# Altium schematic symbol library LATTICEPLDS_Library.SchLib: 291 symbols (part 30 of 32) (continued)
## LFXP15/20-F256/FN256 (continued)
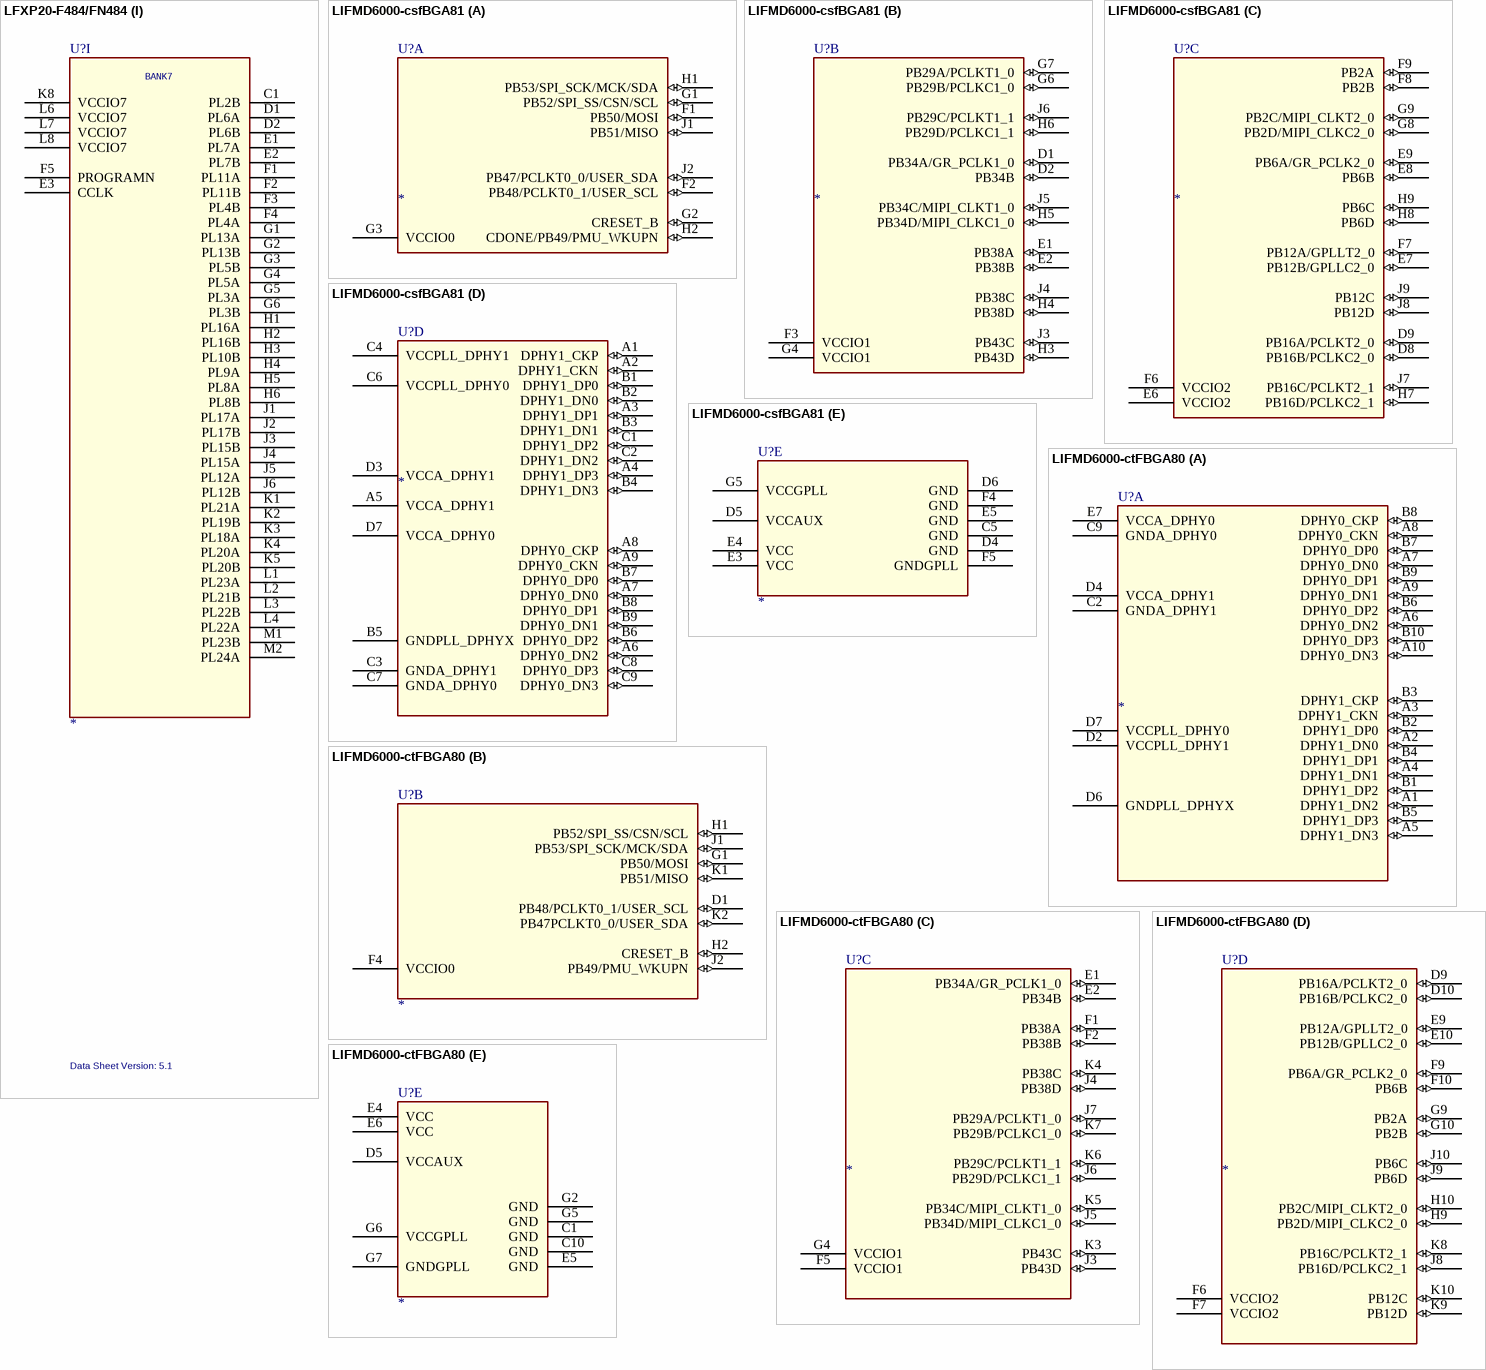
[diagram p280: symbols LFXP20-F484/FN484 to LIFMD6000-ctFBGA80]
part A text: BANK 7; (1 OF 5); BANK 6
part B text: BANK 5; (2 OF 5); BANK 4
part C text: BANK 3; (3 OF 5); BANK 2
part D text: BANK 1; (4 OF 5); BANK 0
part E text: (5 OF 5); SLEEPN (LFXP "C" devices only) / TOE (LFXP "E" devices only)

## LFXP20-F484/FN484
designator U?  Data Sheet Version: 5.1
SWAP_INFO: (S1+S2+S3+S4+S5+S6+S7+S8+S9); SPLIT_INST: TRUE
part A pins: A1 GND (power), A2 GND (power), A21 GND (power), A22 GND (power), AA1 GND (power), AA22 GND (power), AB1 GND (power), AB2 GND (power), AB21 GND (power), AB22 GND (power), B1 GND (power), B22 GND (power), D19 TDI, D20 TCK, E19 TMS, E20 VCCJ (power), F10 VCC (power), F13 VCC (power), F20 TDO, G7 VCCAUX (power), G8 VCCAUX (power), G9 VCC (power), G10 VCC (power), G13 VCC (power), G14 VCC (power), G15 VCCAUX (power), G16 VCCAUX (power), H7 VCCAUX (power), H8 VCC (power), H9 GND (power), H14 GND (power), H15 VCC (power), H16 VCCAUX (power), J7 VCC (power), J8 GND (power), J9 GND (power), J10 GND (power), J11 GND (power), J12 GND (power), J13 GND (power), J14 GND (power), J15 GND (power), J16 VCC (power), K6 VCC (power), K7 VCC (power), K9 GND (power), K10 GND (power), K11 GND (power), K12 GND (power), K13 GND (power), K14 GND (power), K16 VCC (power), K17 VCC (power), L5 VCCP0 (power), L9 GND (power), L10 GND (power), L11 GND (power), L12 GND (power), L13 GND (power), L14 GND (power), L18 VCCP1 (power), M9 GND (power), M10 GND (power), M11 GND (power), M12 GND (power), M13 GND (power), M14 GND (power), M20 GNDP1 (power), N2 GNDP0 (power), N6 VCC (power), N7 VCC (power), N9 GND (power), N10 GND (power), N11 GND (power), N12 GND (power), N13 GND (power), N14 GND (power), N16 VCC (power), N17 VCC (power), P7 VCC (power), P8 GND (power), P9 GND (power), P10 GND (power), P11 GND (power), P12 GND (power), P13 GND (power), P14 GND (power), P15 GND (power), P16 VCC (power), R7 VCCAUX (power), R8 VCC (power), R9 GND (power), R14 GND (power), R15 VCC (power), R16 VCCAUX (power), T7 VCCAUX (power), T8 VCCAUX (power), T9 VCC (power), T10 VCC (power), T13 VCC (power), T14 VCC (power), T15 VCCAUX (power), T16 VCCAUX (power), U10 VCC (power), U13 VCC (power), W4 SLEEPN/TOE
part B pins: A3 PT12A, A4 PT14A, A5 PT16A, A6 PT19A, A7 PT21A, A8 PT24A, A9 PT25A, A10 PT29A, A11 PT29B, B2 PT10B, B3 PT12B, B4 PT14B, B5 PT16B, B6 PT19B, B7 PT21B, B8 PT24B, B9 PT26B, B10 PT22A, B11 PT27B, C2 PT9A, C3 PT8B, C4 PT5A, C5 PT5B, C6 PT6B, C7 PT11A, C8 PT15B, C9 PT20B, C10 PT22B, C11 PT27A, D3 PT8A, D4 CFG1, D5 DONE, D6 PT6A, D7 PT11B, D8 PT15A, D9 PT20A, D10 PT23A, D11 PT28B, E4 PT3B, E5 CFG0, E6 PT4A, E7 PT7A, E8 PT13A, E9 PT17A, E10 PT23B, E11 PT28A, F6 PT4B, F7 PT7B, F8 PT13B, F9 PT18B, F11 VCCIO0 (power), G11 VCCIO0 (power), H10 VCCIO0 (power), H11 VCCIO0 (power)
part C pins: A12 PT30A, A13 PT30B, A14 PT34B, A15 PT37B, A16 PT38B, A17 PT42B, A18 PT44B, A19 PT46B, A20 PT47B, B12 PT32A, B13 PT35A, B14 PT33A, B15 PT37A, B16 PT38A, B17 PT41A, B18 PT44A, B19 PT46A, B20 PT47A, B21 PT53A, C12 PT32B, C13 PT35B, C14 PT39A, C15 PT45B, C16 PT48B, C17 PT51B, C18 PT54A, C19 PT54B, C20 PT56A, C21 PT53B, D12 PT31B, D13 PT36A, D14 PT39B, D15 PT45A, D16 PT48A, D17 PT51A, D18 PT55B, E12 PT31A, E13 PT36B, E14 PT40B, E15 PT43A, E16 PT52A, E17 PT52B, E18 PT55A, F12 VCCIO1 (power), F14 PT40A, F15 PT43B, F16 PT49A, F17 PT50B, G12 VCCIO1 (power), H12 VCCIO1 (power), H13 VCCIO1 (power)
part D pins: C22 PR2B, D21 PR6B, D22 PR6A, E21 PR7B, E22 PR7A, F18 PR3B, F19 PR3A, F21 PR11B, F22 PR11A, G17 PR4B, G18 PR4A, G19 PR5A, G20 PR5B, G21 PR12B, G22 PR12A, H17 PR8B, H18 PR8A, H19 PR9A, H20 PR10B, H21 PR16B, H22 PR16A, J17 PR13B, J18 PR13A, J19 PR15A, J20 PR15B, J21 PR20B, J22 PR20A, K15 VCCIO2 (power), K18 PR19B, K19 PR18A, K20 PR17A, K21 PR17B, K22 PR21A, L15 VCCIO2 (power), L16 VCCIO2 (power), L17 VCCIO2 (power), L19 PR22B, L20 PR22A, L21 PR21B, L22 PR23A, M21 PR24A, M22 PR23B
part E pins: M15 VCCIO3 (power), M16 VCCIO3 (power), M17 VCCIO3 (power), M18 PR28A, M19 PR25B, N15 VCCIO3 (power), N18 PR28B, N19 PR29B, N20 PR29A, N21 PR26A, N22 PR26B, P17 PR38B, P18 PR38A, P19 PR33B, P20 PR33A, P21 PR27A, P22 PR27B, R17 PR42A, R18 PR42B, R19 PR37B, R20 PR37A, R21 PR30A, R22 PR31B, T17 PR44B, T18 PR44A, T19 PR43B, T20 PR43A, T21 PR32A, T22 PR32B, U19 PR46A, U20 PR46B, U21 PR34A, U22 PR34B, V19 PR47A, V20 PR45B, V21 PR36A, V22 PR36B, W20 PR45A, W21 PR39A, W22 PR40B, Y21 PR41A, Y22 PR41B
part F pins: AA12 PB30B, AA13 PB33A, AA14 PB37A, AA15 PB37B, AA16 PB45A, AA17 PB45B, AA18 PB46A, AA19 PB46B, AA20 PB48A, AA21 PB48B, AB13 PB32A, AB14 PB32B, AB15 PB35A, AB16 PB35B, AB17 PB38A, AB18 PB38B, AB19 PB41A, AB20 PB42B, R12 VCCIO4 (power), R13 VCCIO4 (power), T12 VCCIO4 (power), U12 VCCIO4 (power), U14 PB40A, U15 PB43B, U16 PB52B, U17 PB55A, U18 PB53A, V12 PB31B, V13 PB36A, V14 PB40B, V15 PB43A, V16 PB52A, V17 PB55B, V18 PB53B, W12 PB31A, W13 PB36B, W14 PB39A, W15 PB44B, W16 PB47B, W17 PB56A, W18 PB54B, W19 PB54A, Y12 PB30A, Y13 PB34B, Y14 PB39B, Y15 PB44A, Y16 PB47A, Y17 PB49A, Y18 PB50B, Y19 PB51A, Y20 PB51B
part G pins: AA2 PB8A, AA3 PB8B, AA4 PB12A, AA5 PB12B, AA6 PB14A, AA7 PB14B, AA8 PB21A, AA9 PB21B, AA10 PB26B, AA11 PB28B, AB3 PB13A, AB4 PB13B, AB5 PB20A, AB6 PB20B, AB7 PB23A, AB8 PB23B, AB9 PB24A, AB10 PB24B, AB11 PB29A, AB12 PB29B, R10 VCCIO5 (power), R11 VCCIO5 (power), T11 VCCIO5 (power), U5 PB4A, U6 PB6B, U7 PB10B, U8 PB15A, U9 PB18B, U11 VCCIO5 (power), V5 PB4B, V6 PB6A, V7 PB9A, V8 PB15B, V9 PB17A, V10 PB22B, V11 PB27B, W5 INITN, W6 PB7A, W7 PB11B, W8 PB16B, W9 PB19B, W10 PB22A, W11 PB27A, Y3 PB3B, Y4 PB5A, Y5 PB5B, Y6 PB7B, Y7 PB11A, Y8 PB16A, Y9 PB19A, Y10 PB25A, Y11 PB28A
part H pins: M3 PL27B, M4 PL27A, M5 PL30A, M6 VCCIO6 (power), M7 VCCIO6 (power), M8 VCCIO6 (power), N1 PL25B, N3 PL29A, N4 PL29B, N5 PL31B, N8 VCCIO6 (power), P1 PL26B, P2 PL26A, P3 PL34A, P4 PL34B, P5 PL36B, P6 PL36A, R1 PL28B, R2 PL28A, R3 PL39A, R4 PL40B, R5 PL41B, R6 PL41A, T1 PL32B, T2 PL32A, T3 PL43A, T4 PL43B, T5 PL45B, T6 PL45A, U1 PL33B, U2 PL33A, U3 PL46A, U4 PL46B, V1 PL37B, V2 PL37A, V3 PL44B, V4 PL47A, W1 PL38B, W2 PL38A, W3 PL44A, Y1 PL42B, Y2 PL42A
part I pins: C1 PL2B, D1 PL6A, D2 PL6B, E1 PL7A, E2 PL7B, E3 CCLK, F1 PL11A, F2 PL11B, F3 PL4B, F4 PL4A, F5 PROGRAMN, G1 PL13A, G2 PL13B, G3 PL5B, G4 PL5A, G5 PL3A, G6 PL3B, H1 PL16A, H2 PL16B, H3 PL10B, H4 PL9A, H5 PL8A, H6 PL8B, J1 PL17A, J2 PL17B, J3 PL15B, J4 PL15A, J5 PL12A, J6 PL12B, K1 PL21A, K2 PL19B, K3 PL18A, K4 PL20A, K5 PL20B, K8 VCCIO7 (power), L1 PL23A, L2 PL21B, L3 PL22B, L4 PL22A, L6 VCCIO7 (power), L7 VCCIO7 (power), L8 VCCIO7 (power), M1 PL23B, M2 PL24A
part A text: SUPPLIES
part B text: BANK0
part C text: BANK1
part D text: BANK2
part E text: BANK3
part F text: BANK4
part G text: BANK5
part H text: BANK6
part I text: BANK7

## LIFMD6000-csfBGA81
designator U?
SPLIT_INST: TRUE; SWAP_INFO: (S1+S2+S3+S4+S5)
part A pins: F1 PB50/MOSI (io), F2 PB48/PCLKT0_1/USER_SCL (io), G1 PB52/SPI_SS/CSN/SCL (io), G2 CRESET_B (io), G3 VCCIO0 (power), H1 PB53/SPI_SCK/MCK/SDA (io), H2 CDONE/PB49/PMU_WKUPN (io), J1 PB51/MISO (io), J2 PB47/PCLKT0_0/USER_SDA (io)
part B pins: D1 PB34A/GR_PCLK1_0 (io), D2 PB34B (io), E1 PB38A (io), E2 PB38B (io), F3 VCCIO1 (power), G4 VCCIO1 (power), G6 PB29B/PCLKC1_0 (io), G7 PB29A/PCLKT1_0 (io), H3 PB43D (io), H4 PB38D (io), H5 PB34D/MIPI_CLKC1_0 (io), H6 PB29D/PCLKC1_1 (io), J3 PB43C (io), J4 PB38C (io), J5 PB34C/MIPI_CLKT1_0 (io), J6 PB29C/PCLKT1_1 (io)
part C pins: D8 PB16B/PCLKC2_0 (io), D9 PB16A/PCLKT2_0 (io), E6 VCCIO2 (power), E7 PB12B/GPLLC2_0 (io), E8 PB6B (io), E9 PB6A/GR_PCLK2_0 (io), F6 VCCIO2 (power), F7 PB12A/GPLLT2_0 (io), F8 PB2B (io), F9 PB2A (io), G8 PB2D/MIPI_CLKC2_0 (io), G9 PB2C/MIPI_CLKT2_0 (io), H7 PB16D/PCLKC2_1 (io), H8 PB6D (io), H9 PB6C (io), J7 PB16C/PCLKT2_1 (io), J8 PB12D (io), J9 PB12C (io)
part D pins: A1 DPHY1_CKP (io), A2 DPHY1_CKN (io), A3 DPHY1_DP1 (io), A4 DPHY1_DP3 (io), A5 VCCA_DPHY1 (power), A6 DPHY0_DN2 (io), A7 DPHY0_DN0 (io), A8 DPHY0_CKP (io), A9 DPHY0_CKN (io), B1 DPHY1_DP0 (io), B2 DPHY1_DN0 (io), B3 DPHY1_DN1 (io), B4 DPHY1_DN3 (io), B5 GNDPLL_DPHYX (power), B6 DPHY0_DP2 (io), B7 DPHY0_DP0 (io), B8 DPHY0_DP1 (io), B9 DPHY0_DN1 (io), C1 DPHY1_DP2 (io), C2 DPHY1_DN2 (io), C3 GNDA_DPHY1 (power), C4 VCCPLL_DPHY1 (power), C6 VCCPLL_DPHY0 (power), C7 GNDA_DPHY0 (power), C8 DPHY0_DP3 (io), C9 DPHY0_DN3 (io), D3 VCCA_DPHY1 (power), D7 VCCA_DPHY0 (power)
part E pins: C5 GND (power), D4 GND (power), D5 VCCAUX (power), D6 GND (power), E3 VCC (power), E4 VCC (power), E5 GND (power), F4 GND (power), F5 GNDGPLL (power), G5 VCCGPLL (power)

## LIFMD6000-ctFBGA80
designator U?
SWAP_INFO: (S1+S2+S3+S4+S5); SPLIT_INST: TRUE
part A pins: A1 DPHY1_DN2 (io), A2 DPHY1_DN0 (io), A3 DPHY1_CKN (io), A4 DPHY1_DN1 (io), A5 DPHY1_DN3 (io), A6 DPHY0_DN2 (io), A7 DPHY0_DN0 (io), A8 DPHY0_CKN (io), A9 DPHY0_DN1 (io), A10 DPHY0_DN3 (io), B1 DPHY1_DP2 (io), B2 DPHY1_DP0 (io), B3 DPHY1_CKP (io), B4 DPHY1_DP1 (io), B5 DPHY1_DP3 (io), B6 DPHY0_DP2 (io), B7 DPHY0_DP0 (io), B8 DPHY0_CKP (io), B9 DPHY0_DP1 (io), B10 DPHY0_DP3 (io), C2 GNDA_DPHY1 (power), C9 GNDA_DPHY0 (power), D2 VCCPLL_DPHY1 (power), D4 VCCA_DPHY1 (power), D6 GNDPLL_DPHYX (power), D7 VCCPLL_DPHY0 (power), E7 VCCA_DPHY0 (power)
part B pins: D1 PB48/PCLKT0_1/USER_SCL (io), F4 VCCIO0 (power), G1 PB50/MOSI (io), H1 PB52/SPI_SS/CSN/SCL (io), H2 CRESET_B (io), J1 PB53/SPI_SCK/MCK/SDA (io), J2 PB49/PMU_WKUPN (io), K1 PB51/MISO (io), K2 PB47PCLKT0_0/USER_SDA (io)
part C pins: E1 PB34A/GR_PCLK1_0 (io), E2 PB34B (io), F1 PB38A (io), F2 PB38B (io), F5 VCCIO1 (power), G4 VCCIO1 (power), J3 PB43D (io), J4 PB38D (io), J5 PB34D/MIPI_CLKC1_0 (io), J6 PB29D/PCLKC1_1 (io), J7 PB29A/PCLKT1_0 (io), K3 PB43C (io), K4 PB38C (io), K5 PB34C/MIPI_CLKT1_0 (io), K6 PB29C/PCLKT1_1 (io), K7 PB29B/PCLKC1_0 (io)
part D pins: D9 PB16A/PCLKT2_0 (io), D10 PB16B/PCLKC2_0 (io), E9 PB12A/GPLLT2_0 (io), E10 PB12B/GPLLC2_0 (io), F6 VCCIO2 (power), F7 VCCIO2 (power), F9 PB6A/GR_PCLK2_0 (io), F10 PB6B (io), G9 PB2A (io), G10 PB2B (io), H9 PB2D/MIPI_CLKC2_0 (io), H10 PB2C/MIPI_CLKT2_0 (io), J8 PB16D/PCLKC2_1 (io), J9 PB6D (io), J10 PB6C (io), K8 PB16C/PCLKT2_1 (io), K9 PB12D (io), K10 PB12C (io)
part E pins: C1 GND (power), C10 GND (power), D5 VCCAUX (power), E4 VCC (power), E5 GND (power), E6 VCC (power), G2 GND (power), G5 GND (power), G6 VCCGPLL (power), G7 GNDGPLL (power)

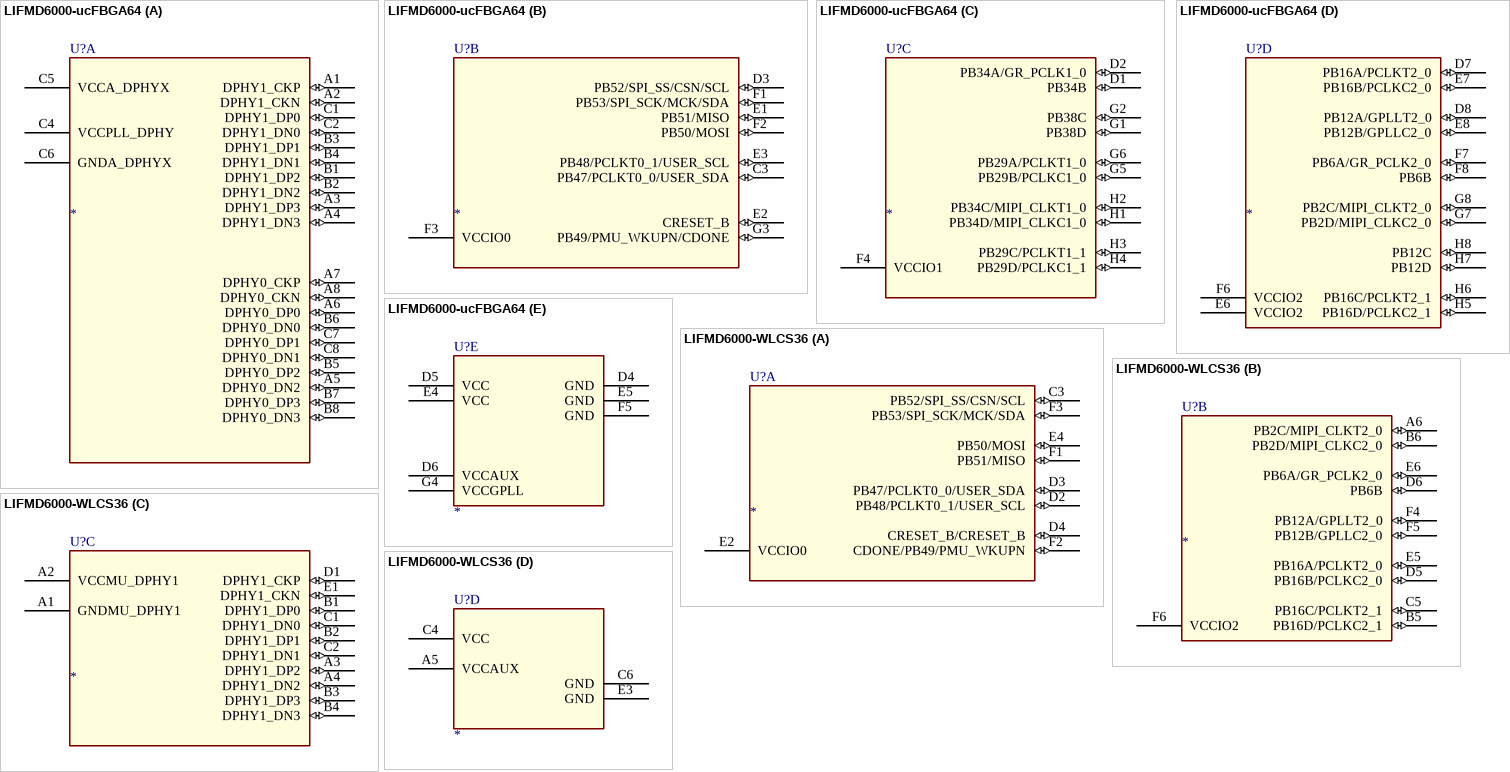
[diagram p281: symbols LIFMD6000-ucFBGA64 to LIFMD6000-WLCS36]

## LIFMD6000-ucFBGA64
designator U?
SPLIT_INST: TRUE; SWAP_INFO: (S1+S2+S3+S4+S5)
part A pins: A1 DPHY1_CKP (io), A2 DPHY1_CKN (io), A3 DPHY1_DP3 (io), A4 DPHY1_DN3 (io), A5 DPHY0_DN2 (io), A6 DPHY0_DP0 (io), A7 DPHY0_CKP (io), A8 DPHY0_CKN (io), B1 DPHY1_DP2 (io), B2 DPHY1_DN2 (io), B3 DPHY1_DP1 (io), B4 DPHY1_DN1 (io), B5 DPHY0_DP2 (io), B6 DPHY0_DN0 (io), B7 DPHY0_DP3 (io), B8 DPHY0_DN3 (io), C1 DPHY1_DP0 (io), C2 DPHY1_DN0 (io), C4 VCCPLL_DPHY (power), C5 VCCA_DPHYX (power), C6 GNDA_DPHYX (power), C7 DPHY0_DP1 (io), C8 DPHY0_DN1 (io)
part B pins: C3 PB47/PCLKT0_0/USER_SDA (io), D3 PB52/SPI_SS/CSN/SCL (io), E1 PB51/MISO (io), E2 CRESET_B (io), E3 PB48/PCLKT0_1/USER_SCL (io), F1 PB53/SPI_SCK/MCK/SDA (io), F2 PB50/MOSI (io), F3 VCCIO0 (power), G3 PB49/PMU_WKUPN/CDONE (io)
part C pins: D1 PB34B (io), D2 PB34A/GR_PCLK1_0 (io), F4 VCCIO1 (power), G1 PB38D (io), G2 PB38C (io), G5 PB29B/PCLKC1_0 (io), G6 PB29A/PCLKT1_0 (io), H1 PB34D/MIPI_CLKC1_0 (io), H2 PB34C/MIPI_CLKT1_0 (io), H3 PB29C/PCLKT1_1 (io), H4 PB29D/PCLKC1_1 (io)
part D pins: D7 PB16A/PCLKT2_0 (io), D8 PB12A/GPLLT2_0 (io), E6 VCCIO2 (power), E7 PB16B/PCLKC2_0 (io), E8 PB12B/GPLLC2_0 (io), F6 VCCIO2 (power), F7 PB6A/GR_PCLK2_0 (io), F8 PB6B (io), G7 PB2D/MIPI_CLKC2_0 (io), G8 PB2C/MIPI_CLKT2_0 (io), H5 PB16D/PCLKC2_1 (io), H6 PB16C/PCLKT2_1 (io), H7 PB12D (io), H8 PB12C (io)
part E pins: D4 GND (power), D5 VCC (power), D6 VCCAUX (power), E4 VCC (power), E5 GND (power), F5 GND (power), G4 VCCGPLL (power)

## LIFMD6000-WLCS36
designator U?
SWAP_INFO: (S1+S2+S3+S4); SPLIT_INST: TRUE
part A pins: C3 PB52/SPI_SS/CSN/SCL (io), D2 PB48/PCLKT0_1/USER_SCL (io), D3 PB47/PCLKT0_0/USER_SDA (io), D4 CRESET_B/CRESET_B (io), E2 VCCIO0 (power), E4 PB50/MOSI (io), F1 PB51/MISO (io), F2 CDONE/PB49/PMU_WKUPN (io), F3 PB53/SPI_SCK/MCK/SDA (io)
part B pins: A6 PB2C/MIPI_CLKT2_0 (io), B5 PB16D/PCLKC2_1 (io), B6 PB2D/MIPI_CLKC2_0 (io), C5 PB16C/PCLKT2_1 (io), D5 PB16B/PCLKC2_0 (io), D6 PB6B (io), E5 PB16A/PCLKT2_0 (io), E6 PB6A/GR_PCLK2_0 (io), F4 PB12A/GPLLT2_0 (io), F5 PB12B/GPLLC2_0 (io), F6 VCCIO2 (power)
part C pins: A1 GNDMU_DPHY1 (power), A2 VCCMU_DPHY1 (power), A3 DPHY1_DP2 (io), A4 DPHY1_DN2 (io), B1 DPHY1_DP0 (io), B2 DPHY1_DP1 (io), B3 DPHY1_DP3 (io), B4 DPHY1_DN3 (io), C1 DPHY1_DN0 (io), C2 DPHY1_DN1 (io), D1 DPHY1_CKP (io), E1 DPHY1_CKN (io)
part D pins: A5 VCCAUX (power), C4 VCC (power), C6 GND (power), E3 GND (power)

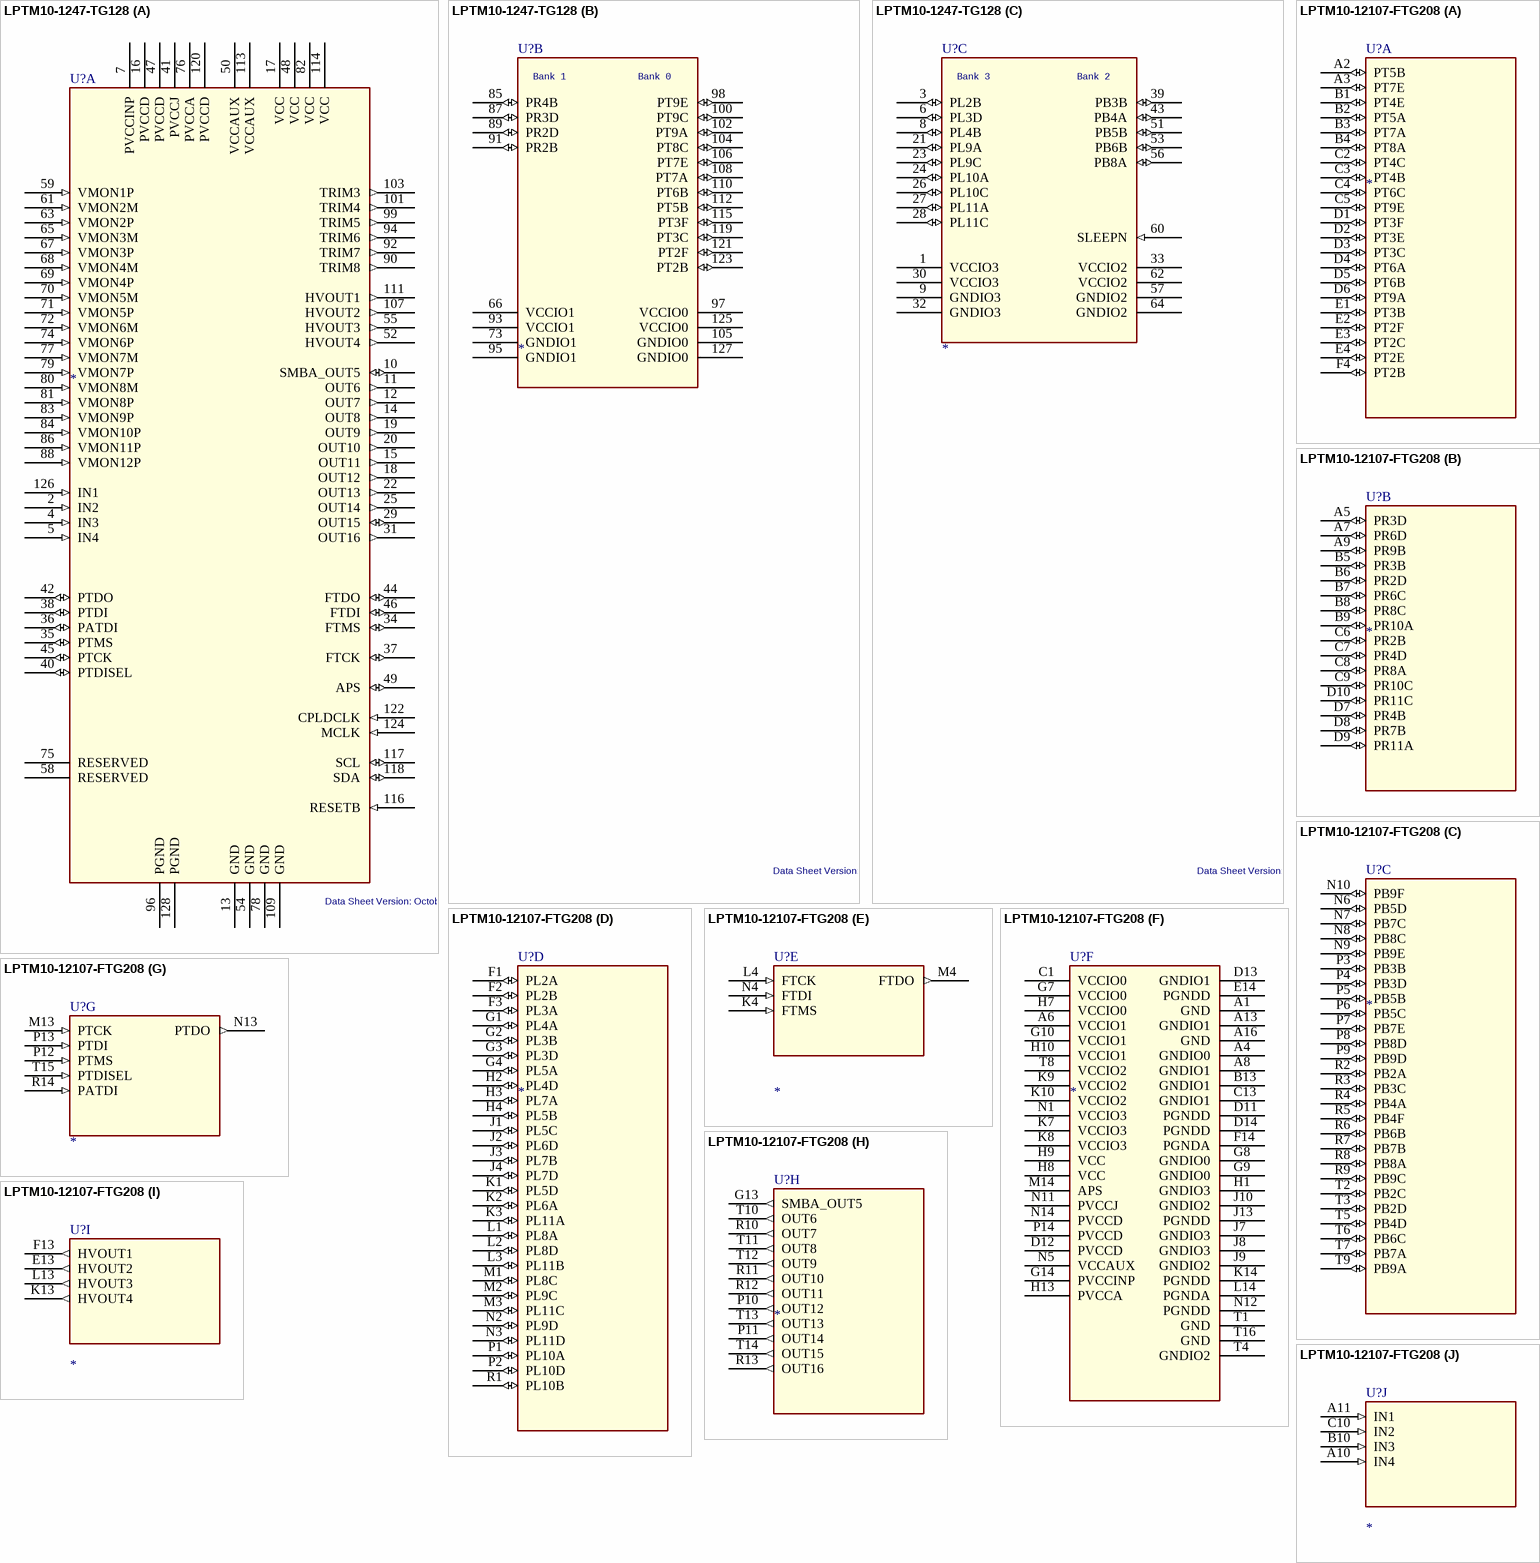
[diagram p282: symbols LPTM10-1247-TG128 to LPTM10-12107-FTG208]

## LPTM10-1247-TG128
designator U?  Data Sheet Version: October 2010
SPLIT_INST: TRUE; SWAP_INFO: (S1+S2+S3)
part A pins: 2 IN2 (in), 4 IN3 (in), 5 IN4 (in), 7 PVCCINP (power), 10 SMBA_OUT5 (io), 11 OUT6 (out), 12 OUT7 (out), 13 GND (power), 14 OUT8 (out), 15 OUT11 (out), 16 PVCCD (power), 17 VCC (power), 18 OUT12 (out), 19 OUT9 (out), 20 OUT10 (out), 22 OUT13 (out), 25 OUT14 (out), 29 OUT15 (io), 31 OUT16 (out), 34 FTMS (io), 35 PTMS (io), 36 PATDI (io), 37 FTCK (io), 38 PTDI (io), 40 PTDISEL (io), 41 PVCCJ (power), 42 PTDO (io), 44 FTDO (io), 45 PTCK (io), 46 FTDI (io), 47 PVCCD (power), 48 VCC (power), 49 APS (io), 50 VCCAUX (power), 52 HVOUT4 (out), 54 GND (power), 55 HVOUT3 (out), 58 RESERVED, 59 VMON1P (in), 61 VMON2M (in), 63 VMON2P (in), 65 VMON3M (in), 67 VMON3P (in), 68 VMON4M (in), 69 VMON4P (in), 70 VMON5M (in), 71 VMON5P (in), 72 VMON6M (in), 74 VMON6P (in), 75 RESERVED, 76 PVCCA (power), 77 VMON7M (in), 78 GND (power), 79 VMON7P (in), 80 VMON8M (in), 81 VMON8P (in), 82 VCC (power), 83 VMON9P (in), 84 VMON10P (in), 86 VMON11P (in), 88 VMON12P (in), 90 TRIM8 (out), 92 TRIM7 (out), 94 TRIM6 (out), 96 PGND (power), 99 TRIM5 (out), 101 TRIM4 (out), 103 TRIM3 (out), 107 HVOUT2 (out), 109 GND (power), 111 HVOUT1 (out), 113 VCCAUX (power), 114 VCC (power), 116 RESETB (in), 117 SCL (io), 118 SDA (io), 120 PVCCD (power), 122 CPLDCLK (in), 124 MCLK (in), 126 IN1 (in), 128 PGND (power)
part B pins: 66 VCCIO1 (power), 73 GNDIO1 (power), 85 PR4B (io), 87 PR3D (io), 89 PR2D (io), 91 PR2B (io), 93 VCCIO1 (power), 95 GNDIO1 (power), 97 VCCIO0 (power), 98 PT9E (io), 100 PT9C (io), 102 PT9A (io), 104 PT8C (io), 105 GNDIO0 (power), 106 PT7E (io), 108 PT7A (io), 110 PT6B (io), 112 PT5B (io), 115 PT3F (io), 119 PT3C (io), 121 PT2F (io), 123 PT2B (io), 125 VCCIO0 (power), 127 GNDIO0 (power)
part C pins: 1 VCCIO3 (power), 3 PL2B (io), 6 PL3D (io), 8 PL4B (io), 9 GNDIO3 (power), 21 PL9A (io), 23 PL9C (io), 24 PL10A (io), 26 PL10C (io), 27 PL11A (io), 28 PL11C (io), 30 VCCIO3 (power), 32 GNDIO3 (power), 33 VCCIO2 (power), 39 PB3B (io), 43 PB4A (io), 51 PB5B (io), 53 PB6B (io), 56 PB8A (io), 57 GNDIO2 (power), 60 SLEEPN (in), 62 VCCIO2 (power), 64 GNDIO2 (power)
part B text: Bank 1; Bank 0
part C text: Bank 3; Bank 2

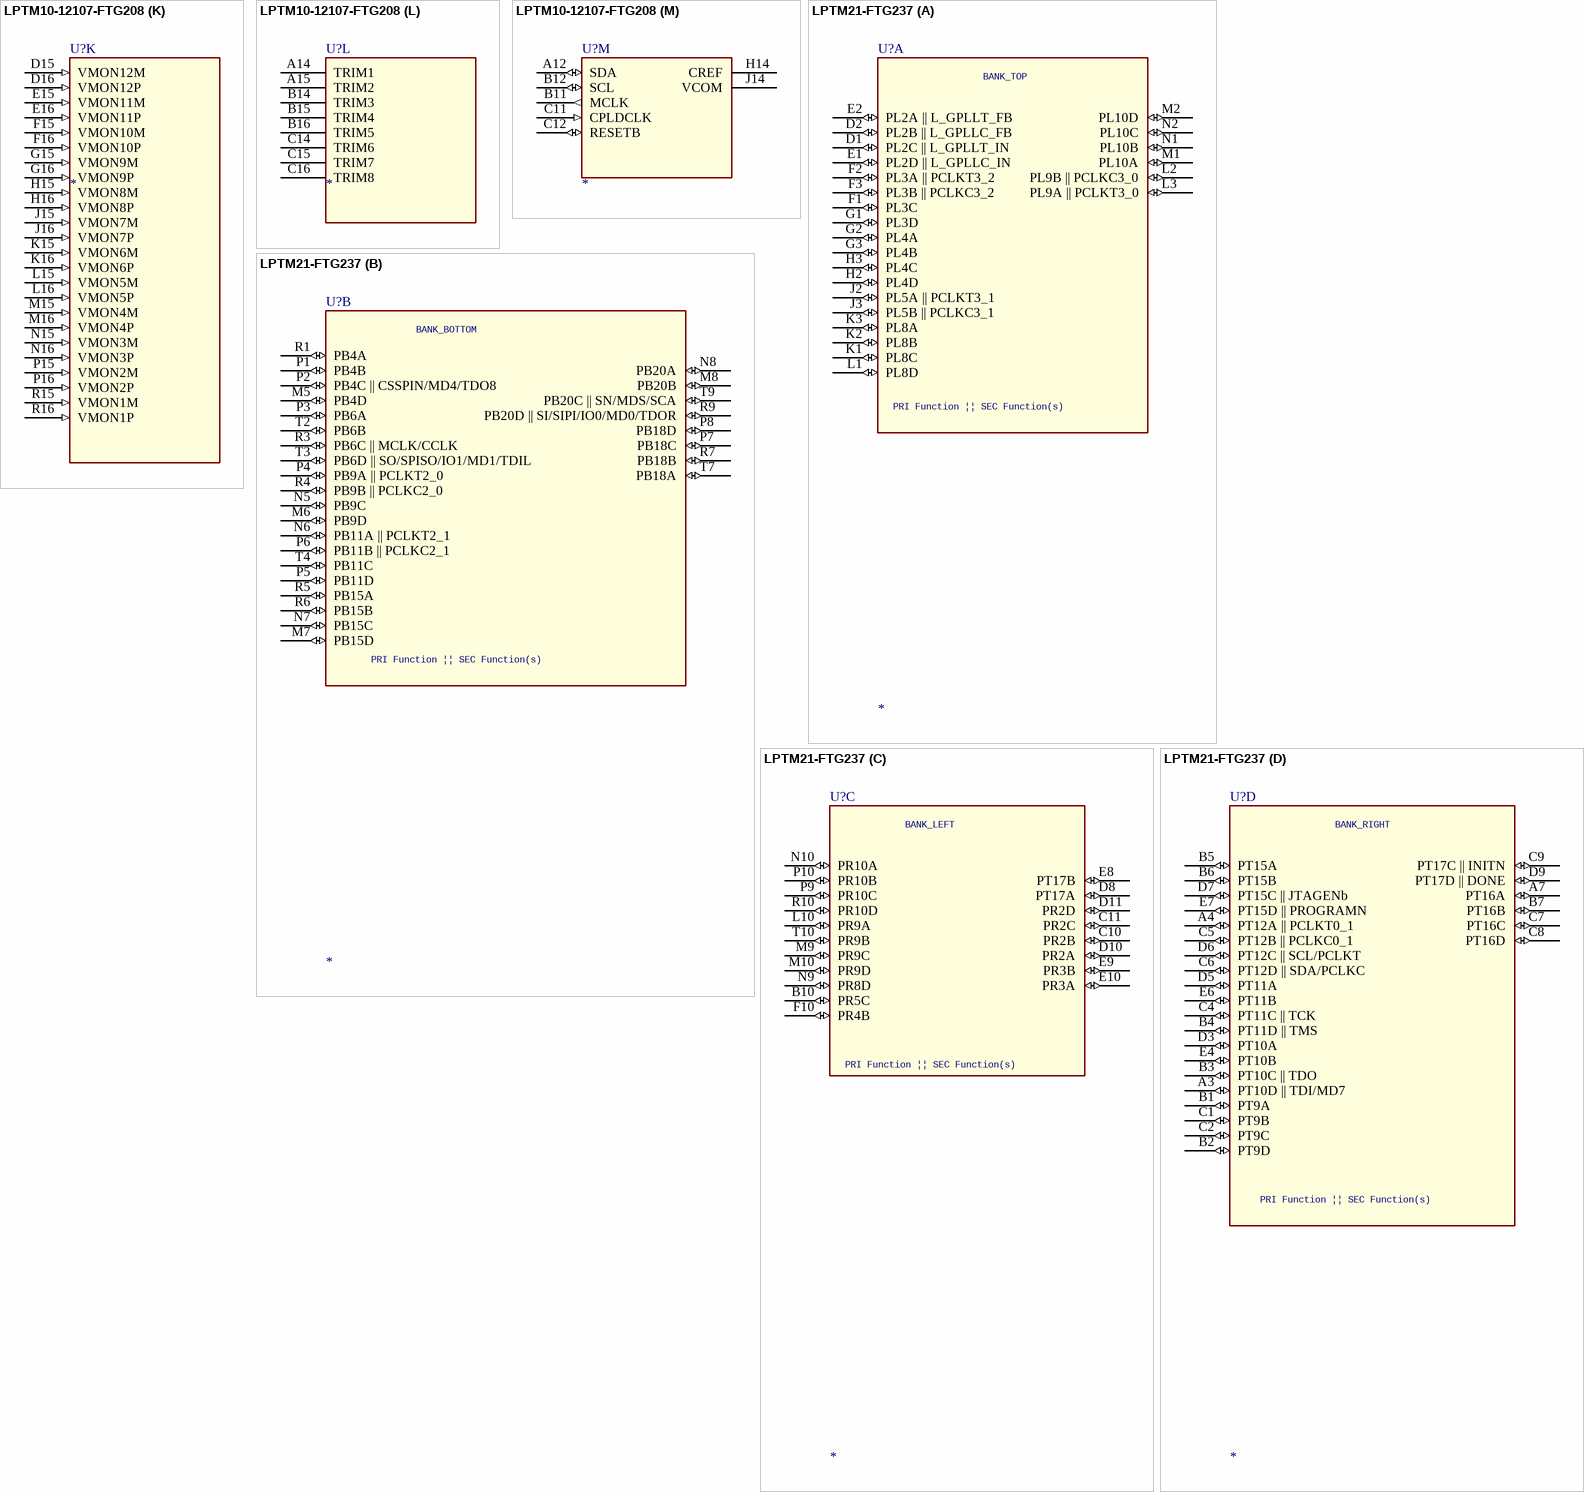
[diagram p283: symbols LPTM10-12107-FTG208 to LPTM21-FTG237]

## LPTM10-12107-FTG208
designator U?
SWAP_INFO: (S1+S2+S3+S4+S5+S6+S7+S8+S9+S10+S11+S12+S13); SPLIT_INST: TRUE
part A pins: A2 PT5B (io), A3 PT7E (io), B1 PT4E (io), B2 PT5A (io), B3 PT7A (io), B4 PT8A (io), C2 PT4C (io), C3 PT4B (io), C4 PT6C (io), C5 PT9E (io), D1 PT3F (io), D2 PT3E (io), D3 PT3C (io), D4 PT6A (io), D5 PT6B (io), D6 PT9A (io), E1 PT3B (io), E2 PT2F (io), E3 PT2C (io), E4 PT2E (io), F4 PT2B (io)
part B pins: A5 PR3D (io), A7 PR6D (io), A9 PR9B (io), B5 PR3B (io), B6 PR2D (io), B7 PR6C (io), B8 PR8C (io), B9 PR10A (io), C6 PR2B (io), C7 PR4D (io), C8 PR8A (io), C9 PR10C (io), D7 PR4B (io), D8 PR7B (io), D9 PR11A (io), D10 PR11C (io)
part C pins: N6 PB5D (io), N7 PB7C (io), N8 PB8C (io), N9 PB9E (io), N10 PB9F (io), P3 PB3B (io), P4 PB3D (io), P5 PB5B (io), P6 PB5C (io), P7 PB7E (io), P8 PB8D (io), P9 PB9D (io), R2 PB2A (io), R3 PB3C (io), R4 PB4A (io), R5 PB4F (io), R6 PB6B (io), R7 PB7B (io), R8 PB8A (io), R9 PB9C (io), T2 PB2C (io), T3 PB2D (io), T5 PB4D (io), T6 PB6C (io), T7 PB7A (io), T9 PB9A (io)
part D pins: F1 PL2A (io), F2 PL2B (io), F3 PL3A (io), G1 PL4A (io), G2 PL3B (io), G3 PL3D (io), G4 PL5A (io), H2 PL4D (io), H3 PL7A (io), H4 PL5B (io), J1 PL5C (io), J2 PL6D (io), J3 PL7B (io), J4 PL7D (io), K1 PL5D (io), K2 PL6A (io), K3 PL11A (io), L1 PL8A (io), L2 PL8D (io), L3 PL11B (io), M1 PL8C (io), M2 PL9C (io), M3 PL11C (io), N2 PL9D (io), N3 PL11D (io), P1 PL10A (io), P2 PL10D (io), R1 PL10B (io)
part E pins: K4 FTMS (in), L4 FTCK (in), M4 FTDO (out), N4 FTDI (in)
part F pins: A1 GND (power), A4 GNDIO0 (power), A6 VCCIO1 (power), A8 GNDIO1 (power), A13 GNDIO1 (power), A16 GND (power), B13 GNDIO1 (power), C1 VCCIO0 (power), C13 GNDIO1 (power), D11 PGNDD (power), D12 PVCCD (power), D13 GNDIO1 (power), D14 PGNDD (power), E14 PGNDD (power), F14 PGNDA (power), G7 VCCIO0 (power), G8 GNDIO0 (power), G9 GNDIO0 (power), G10 VCCIO1 (power), G14 PVCCINP (power), H1 GNDIO3 (power), H7 VCCIO0 (power), H8 VCC (power), H9 VCC (power), H10 VCCIO1 (power), H13 PVCCA (power), J7 GNDIO3 (power), J8 GNDIO3 (power), J9 GNDIO2 (power), J10 GNDIO2 (power), J13 PGNDD (power), K7 VCCIO3 (power), K8 VCCIO3 (power), K9 VCCIO2 (power), K10 VCCIO2 (power), K14 PGNDD (power), L14 PGNDA (power), M14 APS (power), N1 VCCIO3 (power), N5 VCCAUX (power), N11 PVCCJ (power), N12 PGNDD (power), N14 PVCCD (power), P14 PVCCD (power), T1 GND (power), T4 GNDIO2 (power), T8 VCCIO2 (power), T16 GND (power)
part G pins: M13 PTCK (in), N13 PTDO (out), P12 PTMS (in), P13 PTDI (in), R14 PATDI (in), T15 PTDISEL (in)
part H pins: G13 SMBA_OUT5 (out), P10 OUT12 (out), P11 OUT14 (out), R10 OUT7 (out), R11 OUT10 (out), R12 OUT11 (out), R13 OUT16 (out), T10 OUT6 (out), T11 OUT8 (out), T12 OUT9 (out), T13 OUT13 (out), T14 OUT15 (out)
part I pins: E13 HVOUT2 (out), F13 HVOUT1 (out), K13 HVOUT4 (out), L13 HVOUT3 (out)
part J pins: A10 IN4 (in), A11 IN1 (in), B10 IN3 (in), C10 IN2 (in)
part K pins: D15 VMON12M (in), D16 VMON12P (in), E15 VMON11M (in), E16 VMON11P (in), F15 VMON10M (in), F16 VMON10P (in), G15 VMON9M (in), G16 VMON9P (in), H15 VMON8M (in), H16 VMON8P (in), J15 VMON7M (in), J16 VMON7P (in), K15 VMON6M (in), K16 VMON6P (in), L15 VMON5M (in), L16 VMON5P (in), M15 VMON4M (in), M16 VMON4P (in), N15 VMON3M (in), N16 VMON3P (in), P15 VMON2M (in), P16 VMON2P (in), R15 VMON1M (in), R16 VMON1P (in)
part L pins: A14 TRIM1, A15 TRIM2, B14 TRIM3, B15 TRIM4, B16 TRIM5, C14 TRIM6, C15 TRIM7, C16 TRIM8
part M pins: A12 SDA (io), B11 MCLK (out), B12 SCL (io), C11 CPLDCLK (in), C12 RESETB (io), H14 CREF, J14 VCOM

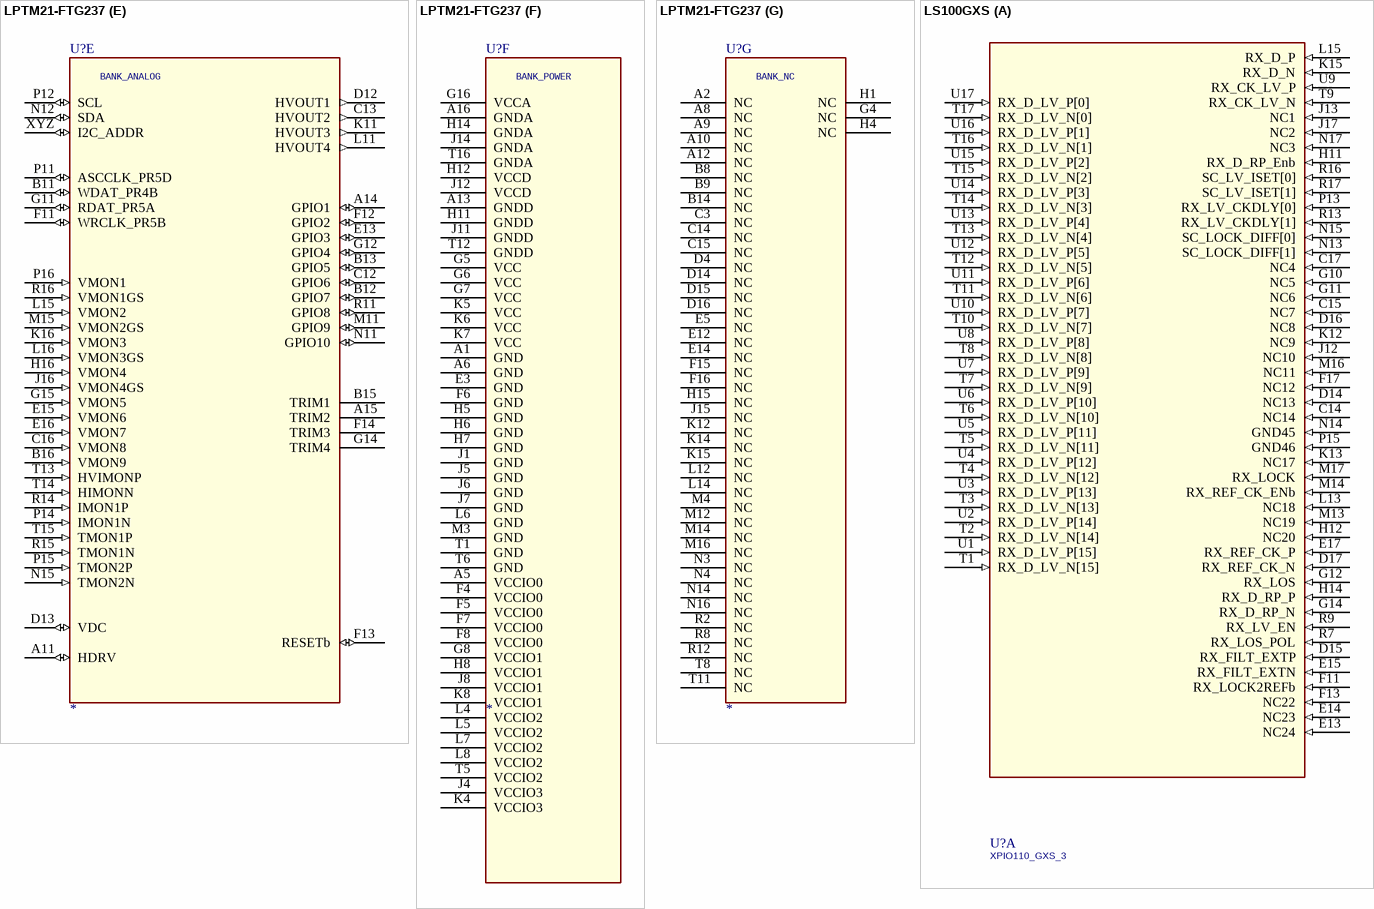
[diagram p284: symbols LPTM21-FTG237 to LS100GXS]